# Altium footprint library Elettronica FM.PcbLib: 387 footprints (part 15 of 25)
Each footprint in its own frame and in the unit in brackets; x right, y up, seen from the top. Pads: shape width x height; smd on the part's side, far side on the other; paste and mask are expansions set on the pad; w line width, h text height; cw(c..) or ccw(c..) is an arc to the next point about the centre after c.
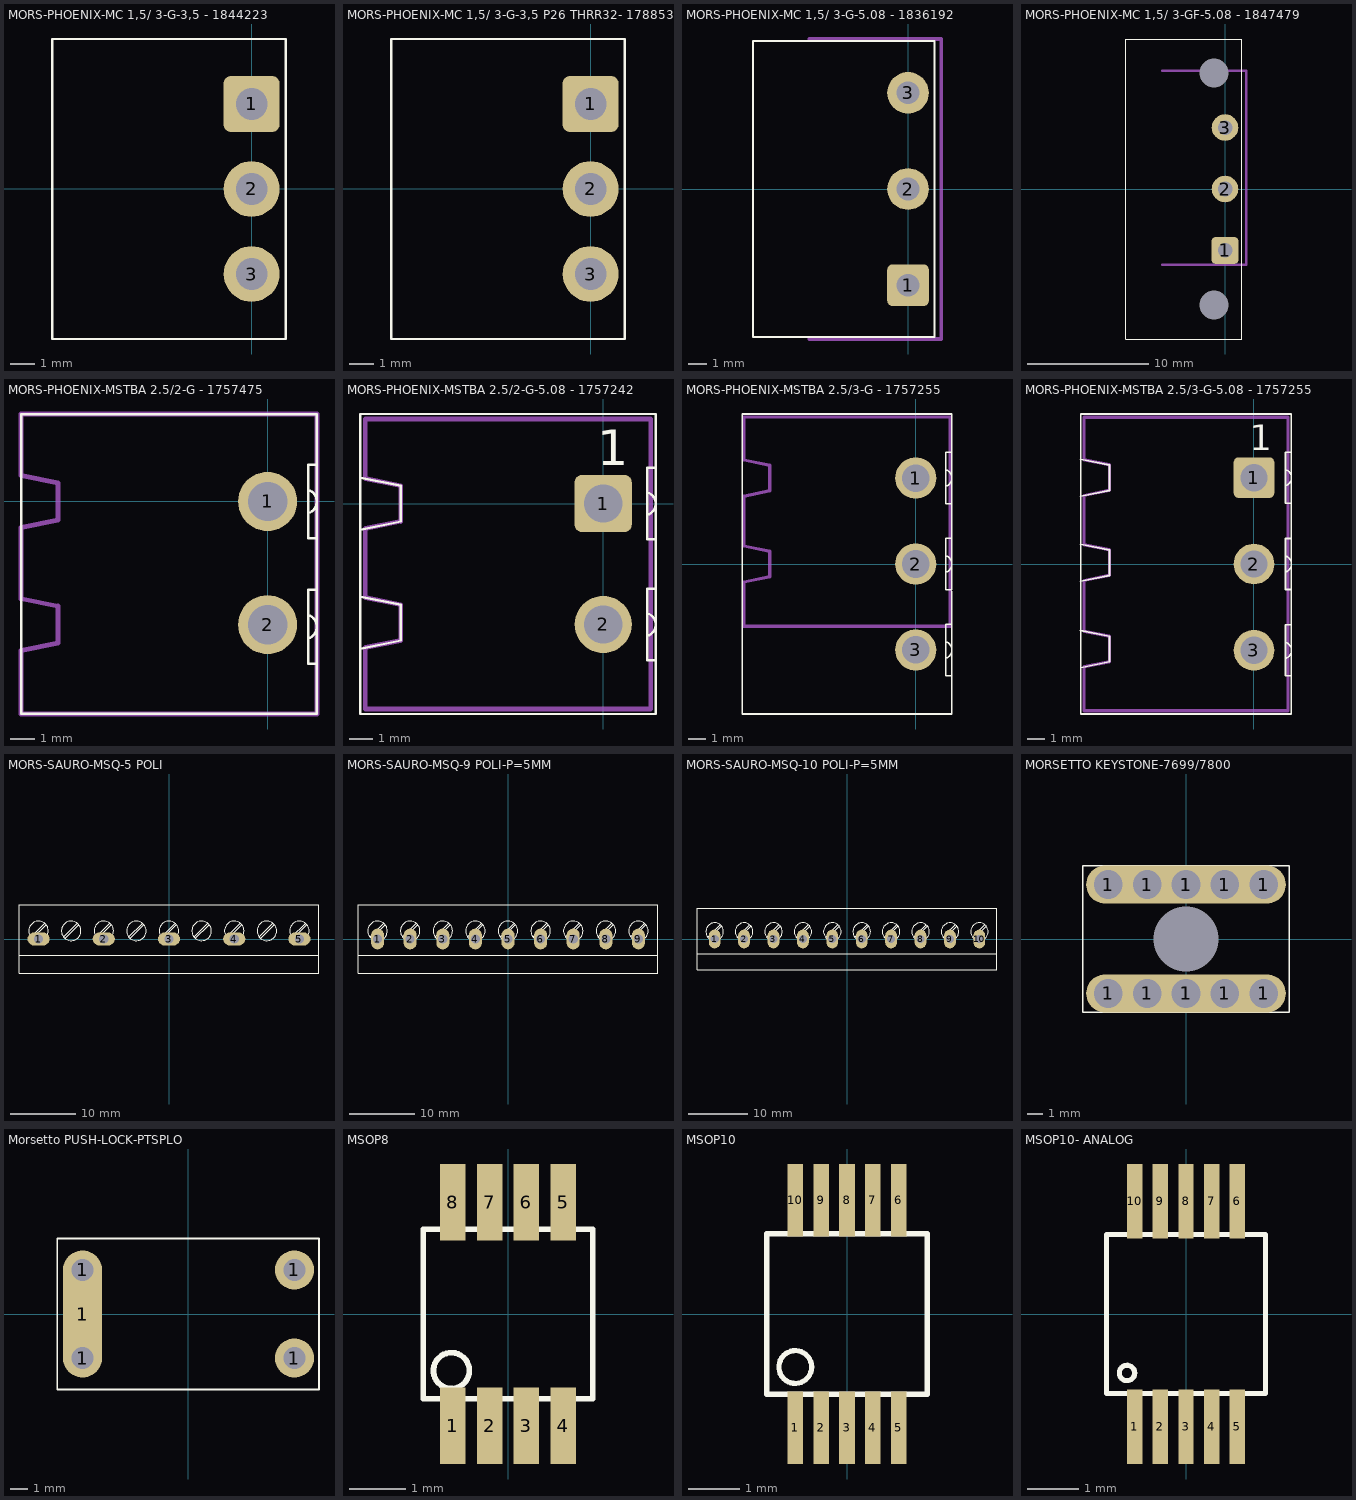
[diagram p14: the footprints below, top view; thin cyan lines are the x and y axes]

## MORS-PHOENIX-MC 1,5/ 3-G-3,5 - 1844223 [mm]
height 4.8
pads (3):
  rrect25% 2.3x2.3 hole 1.3: 1(0,3.5)
  round 2.3 hole 1.3: 2(0,0) 3(0,-3.5)
Top Overlay:
  lines w0.1: -8.2,-6.175 1.4,-6.175 1.4,6.175 -8.2,6.175 -8.2,-6.175
3D body "pxc_1844223_05_MC-1-5-3-G-3-5_3D.stp": height 7.25, standoff -3.4, extent -8,-5.95 1.2,5.95

## MORS-PHOENIX-MC 1,5/ 3-G-3,5 P26 THRR32- 1788534 [mm]
height 4.8
pads (3):
  rrect25% 2.3x2.3 hole 1.3: 1(0,3.5)
  round 2.3 hole 1.3: 2(0,0) 3(0,-3.5)
Top Overlay:
  lines w0.1: -8.2,-6.175 -8.2,6.175 1.4,6.175 1.4,-6.175 -8.2,-6.175
3D body "pxc_1788534_00_MC-1-5-3-G-3-5-P26-THRR32_3D.stp": height 6.9, standoff -2.6, extent -8,-5.945 1.2,5.945

## MORS-PHOENIX-MC 1,5/ 3-G-5.08 - 1836192 [mm]
height 4.8
pads (3):
  rrect25% 2.2x2.2 hole 1.2: 1(0,-5.08)
  round 2.2 hole 1.2: 2(0,0) 3(0,5.08)
Top Overlay:
  lines w0.1: -8.2,-7.825 1.4,-7.825 1.4,7.825 -8.2,7.825 -8.2,-7.825
Mechanical 32:
  lines w0.2: -5.2,-7.925 1.75,-7.925 1.75,7.925 -5.2,7.925
3D body "pxc_1836192_04_MC-1-5-3-G-5-08_3D.stp": height 7.25, standoff -3.4, extent -8,-7.62 1.2,7.62

## MORS-PHOENIX-MC 1,5/ 3-GF-5.08 - 1847479 [mm]
height 4.8
pads (5):
  rrect25% 0x0 hole 2.4 unplated: 0(-0.9,-9.58) 0(-0.9,9.58)
  rrect25% 2.2x2.2 hole 1.2: 1(0,-5.08)
  round 2.2 hole 1.2: 2(0,0) 3(0,5.08)
Top Overlay:
  lines w0.1: -8.2,-12.4 -8.2,12.4 1.4,12.4 1.4,-12.4 -8.2,-12.4
Mechanical 32:
  lines w0.2: -5.2,-6.275 1.75,-6.275 1.75,9.775 -5.2,9.775
3D body "pxc_1847479_06_MC-1-5-3-GF-5-08_3D.stp": height 7.25, standoff -3.5, extent -8,-12.18 1.2,12.18

## MORS-PHOENIX-MSTBA 2.5/2-G - 1757475 [mm]
height 4.8
pads (2):
  round 2.4 hole 1.6: 1(0,0) 2(0,-5)
Top Overlay:
  lines w0.1: -0.504,-5.571 cw(c-0.004,-5.081) -0.504,-4.592 ; -0.504,-0.491 cw(c-0.004,-0.001) -0.504,0.488 ; -0.494,-5.581 ccw(c-0.004,-5.081) 0.486,-5.581 ; -0.494,-4.581 cw(c-0.004,-5.081) 0.486,-4.581 ; -0.494,-0.501 ccw(c-0.004,-0.001) 0.486,-0.501 ; -0.494,0.499 cw(c-0.004,-0.001) 0.486,0.499 ; 0.496,-5.571 ccw(c-0.004,-5.081) 0.496,-4.592 ; 0.496,-0.491 ccw(c-0.004,-0.001) 0.496,0.488 ; 1.996,-5.129 1.996,-6.581 ; 1.996,-5.034 1.996,-3.581 ; 1.996,-0.049 1.996,-1.501 ; 1.996,0.046 1.996,1.499 ; 1.646,-5.558 ccw(c1.499,-5.081) 1.646,-4.604 ; 1.646,-5.558 1.646,-6.581 1.996,-6.581 ; 1.646,-5.558 1.646,-4.604 ; 1.646,-4.604 1.646,-3.581 1.996,-3.581 ; 1.646,-0.478 ccw(c1.499,-0.001) 1.646,0.476 ; 1.646,-0.478 1.646,0.476 ; 1.646,-0.478 1.646,-1.501 1.996,-1.501 ; 1.646,0.476 1.646,1.499 1.996,1.499 ; 1.996,-6.581 1.996,-8.621 -10.004,-8.621 -10.004,3.539 1.996,3.539 1.996,1.499 ; 1.996,-3.581 1.996,-1.501
Mechanical 1:
  lines w0.013: 0.504,3.501 1.254,3.501
Mechanical 32:
  lines w0.2: -10,-8.625 -10,-6.05 -8.5,-5.75 -8.5,-4.25 -10,-3.95 -10,-1.05 -8.5,-0.75 -8.5,0.75 -10,1.05 -10,3.55 2,3.55 2,-8.625 -10,-8.625
3D body "1757242_06.stp": height 8.6, standoff -3.5, extent -10.002,-8.598 2.001,3.562

## MORS-PHOENIX-MSTBA 2.5/2-G-5.08 - 1757242 [mm]
height 4.8
pads (2):
  rrect25% 2.4x2.4 hole 1.6: 1(0,0)
  round 2.4 hole 1.6: 2(0,-5.08)
Top Overlay:
  lines w0.1: -10.202,-6.095 -8.5,-5.755 -8.5,-4.255 -10.202,-3.915 ; -10.202,-1.095 -8.5,-0.755 -8.5,0.745 -10.202,1.085 ; -0.504,-5.571 cw(c-0.004,-5.081) -0.504,-4.592 ; -0.504,-0.491 cw(c-0.004,-0.001) -0.504,0.488 ; -0.494,-5.581 ccw(c-0.004,-5.081) 0.486,-5.581 ; -0.494,-4.581 cw(c-0.004,-5.081) 0.486,-4.581 ; -0.494,-0.501 ccw(c-0.004,-0.001) 0.486,-0.501 ; -0.494,0.499 cw(c-0.004,-0.001) 0.486,0.499 ; 0.496,-5.571 ccw(c-0.004,-5.081) 0.496,-4.592 ; 0.496,-0.491 ccw(c-0.004,-0.001) 0.496,0.488 ; 2.2,-5.132 2.2,-6.585 ; 2.2,-5.038 2.2,-3.585 ; 2.2,-0.052 2.2,-1.505 ; 2.2,0.042 2.2,1.495 ; 1.85,-5.562 ccw(c1.703,-5.085) 1.85,-4.608 ; 1.85,-5.562 1.85,-4.608 ; 1.85,-5.562 1.85,-6.585 2.2,-6.585 ; 1.85,-4.608 1.85,-3.585 2.2,-3.585 ; 1.85,-0.482 ccw(c1.703,-0.005) 1.85,0.472 ; 1.85,-0.482 1.85,-1.505 2.2,-1.505 ; 1.85,-0.482 1.85,0.472 ; 1.85,0.472 1.85,1.495 2.2,1.495 ; 2.2,-6.585 2.2,-8.837 -10.2,-8.84 -10.2,3.76 2.2,3.76 2.2,1.495 ; 2.2,-3.585 2.2,-1.505
  text "1" at -0.25,1.6 h1.5
Mechanical 1:
  lines w0.013: 0.504,3.501 1.254,3.501
Mechanical 32:
  lines w0.2: -10,-8.625 2,-8.625 2,3.55 -10,3.55 -10,1.05 -8.5,0.75 -8.5,-0.75 -10,-1.05 -10,-3.95 -8.5,-4.25 -8.5,-5.75 -10,-6.05 -10,-8.625
3D body "1757242_06.stp": height 8.6, standoff -3.5, extent -10.002,-8.62 2,3.54

## MORS-PHOENIX-MSTBA 2.5/3-G - 1757255 [mm]
height 4.8
pads (3):
  round 2.4 hole 1.6: 1(0,5) 2(0,0) 3(0,-5)
Top Overlay:
  lines w0.1: 2.1,-5.047 2.1,-6.5 1.75,-6.5 1.75,-5.477 ; 2.1,-4.953 2.1,-3.5 1.75,-3.5 1.75,-4.523 ; 2.1,-1.581 2.1,-8.725 -10.1,-8.725 -10.1,8.725 2.1,8.725 2.1,6.499 ; 2.1,-0.047 2.1,-1.5 1.75,-1.5 1.75,-0.477 ; 2.1,0.047 2.1,1.5 1.75,1.5 1.75,0.477 ; 2.1,1.419 2.1,3.499 ; 2.1,4.953 2.1,3.5 1.75,3.5 1.75,4.523 ; 2.1,5.047 2.1,6.5 1.75,6.5 1.75,5.477 ; 1.75,-5.477 ccw(c1.603,-5) 1.75,-4.523 ; 1.75,-5.477 1.75,-4.523 ; 1.75,-0.477 ccw(c1.603,0) 1.75,0.477 ; 1.75,-0.477 1.75,0.477 ; 1.75,4.523 ccw(c1.603,5) 1.75,5.477 ; 1.75,4.523 1.75,5.477
Mechanical 32:
  lines w0.2: -10,-3.625 2,-3.625 2,8.55 -10,8.55 -10,6.05 -8.5,5.75 -8.5,4.25 -10,3.95 -10,1.05 -8.5,0.75 -8.5,-0.75 -10,-1.05 -10,-3.625
3D body "pxc_1757255_08_MSTBA-2-5-3-G-5-08_3D.stp": height 8.6, standoff -3.5, extent -10.002,-8.62 2,8.62

## MORS-PHOENIX-MSTBA 2.5/3-G-5.08 - 1757255 [mm]
height 4.8
pads (3):
  rrect25% 2.4x2.4 hole 1.6: 1(0,5.08)
  round 2.4 hole 1.6: 2(0,0) 3(0,-5.08)
Top Overlay:
  lines w0.1: -10.203,-3.914 -8.5,-4.255 -8.5,-5.755 -10.201,-6.095 ; -10.202,-1.015 -8.5,-0.675 -8.5,0.825 -10.202,1.165 ; -10.202,3.985 -8.5,4.325 -8.5,5.825 -10.202,6.165 ; -0.504,-5.571 cw(c-0.004,-5.081) -0.504,-4.592 ; -0.504,-0.491 cw(c-0.004,-0.001) -0.504,0.488 ; -0.504,4.589 cw(c-0.004,5.079) -0.504,5.568 ; -0.494,-5.581 ccw(c-0.004,-5.081) 0.486,-5.581 ; -0.494,-4.581 cw(c-0.004,-5.081) 0.486,-4.581 ; -0.494,-0.501 ccw(c-0.004,-0.001) 0.486,-0.501 ; -0.494,0.499 cw(c-0.004,-0.001) 0.486,0.499 ; -0.494,4.579 ccw(c-0.004,5.079) 0.486,4.579 ; -0.494,5.579 cw(c-0.004,5.079) 0.486,5.579 ; 0.496,-5.571 ccw(c-0.004,-5.081) 0.496,-4.592 ; 0.496,-0.491 ccw(c-0.004,-0.001) 0.496,0.488 ; 0.496,4.589 ccw(c-0.004,5.079) 0.496,5.568 ; 2.2,-5.129 2.2,-6.581 ; 2.2,-5.034 2.2,-3.581 ; 2.2,-0.049 2.2,-1.501 ; 2.2,0.046 2.2,1.499 ; 2.2,5.031 2.2,3.579 ; 2.2,5.126 2.2,6.579 ; 1.85,-5.558 ccw(c1.703,-5.081) 1.85,-4.604 ; 1.85,-5.558 1.85,-6.581 2.2,-6.581 ; 1.85,-5.558 1.85,-4.604 ; 1.85,-4.604 1.85,-3.581 2.2,-3.581 ; 1.85,-0.478 ccw(c1.703,-0.001) 1.85,0.476 ; 1.85,-0.478 1.85,0.476 ; 1.85,-0.478 1.85,-1.501 2.2,-1.501 ; 1.85,0.476 1.85,1.499 2.2,1.499 ; 1.85,4.602 ccw(c1.703,5.079) 1.85,5.556 ; 1.85,4.602 1.85,3.579 2.2,3.579 ; 1.85,4.602 1.85,5.556 ; 1.85,5.556 1.85,6.579 2.2,6.579 ; 2.2,-6.581 2.2,-8.825 -10.2,-8.825 -10.2,8.825 2.2,8.825 2.2,6.579 ; 2.2,-3.581 2.2,-1.501 ; 2.2,1.499 2.2,3.579
  text "1" at -0.25,6.68 h1.5
Mechanical 1:
  lines w0.013: 0.504,8.581 1.254,8.581
Mechanical 32:
  lines w0.2: -10,-8.625 2,-8.625 2,8.63 -10,8.63 -10,6.13 -8.5,5.83 -8.5,4.33 -10,4.03 -10,1.13 -8.5,0.83 -8.5,-0.67 -10,-0.97 -10,-3.95 -8.5,-4.25 -8.5,-5.75 -10,-6.05 -10,-8.625
3D body "pxc_1757255_08_MSTBA-2-5-3-G-5-08_3D.stp": height 8.6, standoff -3.5, extent -10.002,-8.62 2,8.62

## MORS-SAURO-MSQ-5 POLI [mm]
pads (5):
  oval 3.4x2 hole 1.4 mask+0.1: 1(-20,0) 2(-10,0) 3(0,0) 4(10,0) 5(20,0)
Top Overlay:
  circle w0.1: c20,1.25 r1.5
  circle w0.1: c10,1.25 r1.5
  circle w0.1: c15,1.25 r1.5
  circle w0.1: c5,1.25 r1.5
  circle w0.1: c0,1.25 r1.5
  circle w0.1: c-5,1.25 r1.5
  circle w0.1: c-10,1.25 r1.5
  circle w0.1: c-15,1.25 r1.5
  circle w0.1: c-20,1.25 r1.5
  lines w0.1: -23,-2.5 23,-2.5 ; -21.149,0.313 -19.063,2.399 ; -20.937,0.101 -18.851,2.187 ; -16.149,0.313 -14.063,2.399 ; -15.937,0.101 -13.851,2.187 ; -11.149,0.313 -9.063,2.399 ; -10.937,0.101 -8.851,2.187 ; -6.149,0.313 -4.063,2.399 ; -5.937,0.101 -3.851,2.187 ; -1.149,0.313 0.937,2.399 ; -0.937,0.101 1.149,2.187 ; 3.851,0.313 5.937,2.399 ; 4.063,0.101 6.149,2.187 ; 8.851,0.313 10.937,2.399 ; 9.063,0.101 11.149,2.187 ; 13.851,0.313 15.937,2.399 ; 14.063,0.101 16.149,2.187 ; 18.851,0.313 20.937,2.399 ; 19.063,0.101 21.149,2.187 ; -23,-5.25 23,-5.25 23,5.25 -23,5.25 -23,-5.25
3D body "msq05002.stp": height 18.6, standoff -3.8, extent -22.75,-5 22.75,5

## MORS-SAURO-MSQ-9 POLI-P=5MM [mm]
pads (9):
  oval 2x3.2 hole 1.4 mask+0.1: 1(-20,0) 2(-15,0) 3(-10,0) 4(-5,0) 5(0,0) 6(5,0) 7(10,0) 8(15,0) 9(20,0)
Top Overlay:
  circle w0.1: c-20,1.25 r1.5
  circle w0.1: c-15,1.25 r1.5
  circle w0.1: c-10,1.25 r1.5
  circle w0.1: c-5,1.25 r1.5
  circle w0.1: c0,1.25 r1.5
  circle w0.1: c5,1.25 r1.5
  circle w0.1: c15,1.25 r1.5
  circle w0.1: c10,1.25 r1.5
  circle w0.1: c20,1.25 r1.5
  lines w0.1: -23,-2.5 23,-2.5 ; -21.149,0.313 -19.063,2.399 ; -20.937,0.101 -18.851,2.187 ; -16.149,0.313 -14.063,2.399 ; -15.937,0.101 -13.851,2.187 ; -11.149,0.313 -9.063,2.399 ; -10.937,0.101 -8.851,2.187 ; -6.149,0.313 -4.063,2.399 ; -5.937,0.101 -3.851,2.187 ; -1.149,0.313 0.937,2.399 ; -0.937,0.101 1.149,2.187 ; 3.851,0.313 5.937,2.399 ; 4.063,0.101 6.149,2.187 ; 8.851,0.313 10.937,2.399 ; 9.063,0.101 11.149,2.187 ; 13.851,0.313 15.937,2.399 ; 14.063,0.101 16.149,2.187 ; 18.851,0.313 20.937,2.399 ; 19.063,0.101 21.149,2.187 ; -23,-5.25 -23,5.25 23,5.25 23,-5.25 -23,-5.25
3D body "msq05002.stp": height 18.6, standoff -3.8, extent -22.75,-5 22.75,5

## MORS-SAURO-MSQ-10 POLI-P=5MM [mm]
pads (10):
  oval 2x3.2 hole 1.4 mask+0.1: 1(-22.5,0) 2(-17.5,0) 3(-12.5,0) 4(-7.5,0) 5(-2.5,0) 6(2.5,0) 7(7.5,0) 8(12.5,0) 9(17.5,0) 10(22.5,0)
Top Overlay:
  circle w0.1: c22.5,1.25 r1.5
  circle w0.1: c-22.5,1.25 r1.5
  circle w0.1: c-17.5,1.25 r1.5
  circle w0.1: c-12.5,1.25 r1.5
  circle w0.1: c-7.5,1.25 r1.5
  circle w0.1: c-2.5,1.25 r1.5
  circle w0.1: c2.5,1.25 r1.5
  circle w0.1: c12.5,1.25 r1.5
  circle w0.1: c7.5,1.25 r1.5
  circle w0.1: c17.5,1.25 r1.5
  lines w0.1: -25.5,-2.5 25.5,-2.5 ; -23.649,0.313 -21.563,2.399 ; -23.437,0.101 -21.351,2.187 ; -18.649,0.313 -16.563,2.399 ; -18.437,0.101 -16.351,2.187 ; -13.649,0.313 -11.563,2.399 ; -13.437,0.101 -11.351,2.187 ; -8.649,0.313 -6.563,2.399 ; -8.437,0.101 -6.351,2.187 ; -3.649,0.313 -1.563,2.399 ; -3.437,0.101 -1.351,2.187 ; 1.351,0.313 3.437,2.399 ; 1.563,0.101 3.649,2.187 ; 6.351,0.313 8.437,2.399 ; 6.563,0.101 8.649,2.187 ; 11.351,0.313 13.437,2.399 ; 11.563,0.101 13.649,2.187 ; 16.351,0.313 18.437,2.399 ; 16.563,0.101 18.649,2.187 ; 21.351,0.313 23.437,2.399 ; 21.563,0.101 23.649,2.187 ; -25.5,-5.25 -25.5,5.25 25.5,5.25 25.5,-5.25 -25.5,-5.25
3D body "msq05002.stp": height 18.6, standoff -3.8, extent -20.25,-5 25.25,5
3D body "msq05002.stp": height 18.6, standoff -3.8, extent -25.25,-5 20.25,5

## MORSETTO KEYSTONE-7699/7800 [mm]
height 40.5
pads (13):
  oval 2.85x2.45 hole 1.85: 1(-5,-3.5) 1(-5,3.5) 1(-2.5,-3.5) 1(-2.5,3.5) 1(0,-3.5) 1(0,3.5) 1(2.5,-3.5) 1(2.5,3.5) 1(5,-3.5) 1(5,3.5)
  oval 12.3x2.45 smd: 1(0,-3.5) 1(0,3.5)
  round 0 hole 4.2 unplated: 1(0,0)
Top Overlay:
  lines w0.1: -6.65,-4.7 6.65,-4.7 6.65,4.7 -6.65,4.7 -6.65,-4.7
3D body "keystone-PN7699.STEP": height 20.92, standoff -5.03, extent -3.95,-3.937 3.924,3.937
3D body "keystone-PN8199.STEP": height 8.29, standoff -5.28, extent -6.45,-4.508 6.428,4.508

## Morsetto PUSH-LOCK-PTSPLO [mm]
height 40.5
pads (5):
  round 2.3 hole 1.3: 1(-6.25,-2.6) 1(-6.25,2.6) 1(6.25,-2.6) 1(6.25,2.6)
  oval 2.3x7.5 smd: 1(-6.25,0)
Top Overlay:
  lines w0.1: -7.75,-4.45 7.7,-4.45 7.7,4.45 -7.75,4.45 -7.75,-4.45
3D body "1705081_00.stp": height 12.5, standoff -2.1, extent -7.638,-4.35 7.588,4.35

## MSOP8 [mm]
height 1.9
pads (8):
  rect 0.45x1.35 smd paste-0.025 mask+0.075: 1(-0.975,-1.975) 2(-0.325,-1.975) 3(0.325,-1.975) 4(0.975,-1.975) 5(0.975,1.975) 6(0.325,1.975) 7(-0.325,1.975) 8(-0.975,1.975)
Top Overlay:
  circle w0.1: c-1,-1 r0.318
  lines w0.1: -1.5,-1.5 1.5,-1.5 1.5,1.5 -1.5,1.5 -1.5,-1.5
3D body: height 1.1, standoff 0, extent -1.5,-1.5 1.5,1.5

## MSOP10 [mm]
height 1.9
pads (10):
  rect 0.3x1.4 smd paste-0.025 mask+0.075: 1(-1,-2.2) 2(-0.5,-2.2) 3(0,-2.2) 4(0.5,-2.2) 5(1,-2.2) 6(1,2.2) 7(0.5,2.2) 8(0,2.2) 9(-0.5,2.2) 10(-1,2.2)
Top Overlay:
  circle w0.1: c-1,-1.025 r0.318
  lines w0.1: -1.55,-1.55 1.55,-1.55 1.55,1.55 -1.55,1.55 -1.55,-1.55

## MSOP10- ANALOG [mm]
height 1.9
pads (10):
  rect 0.3x1.45 smd paste+0 mask+0.05: 1(-1,-2.2) 2(-0.5,-2.2) 3(0,-2.2) 4(0.5,-2.2) 5(1,-2.2) 6(1,2.2) 7(0.5,2.2) 8(0,2.2) 9(-0.5,2.2) 10(-1,2.2)
Top Overlay:
  circle w0.1: c-1.15,-1.15 r0.15
  lines w0.1: -1.55,-1.55 1.55,-1.55 1.55,1.55 -1.55,1.55 -1.55,-1.55
3D body: height 1.1, standoff 0, extent -1.55,-1.55 1.55,1.55